# Altium footprint library Библиотека посадочных мест.PcbLib: 128 footprints (part 6 of 8)
Each footprint in its own frame and in the unit in brackets; x right, y up, seen from the top. Pads: shape width x height; smd on the part's side, far side on the other; paste and mask are expansions set on the pad; w line width, h text height; cw(c..) or ccw(c..) is an arc to the next point about the centre after c.
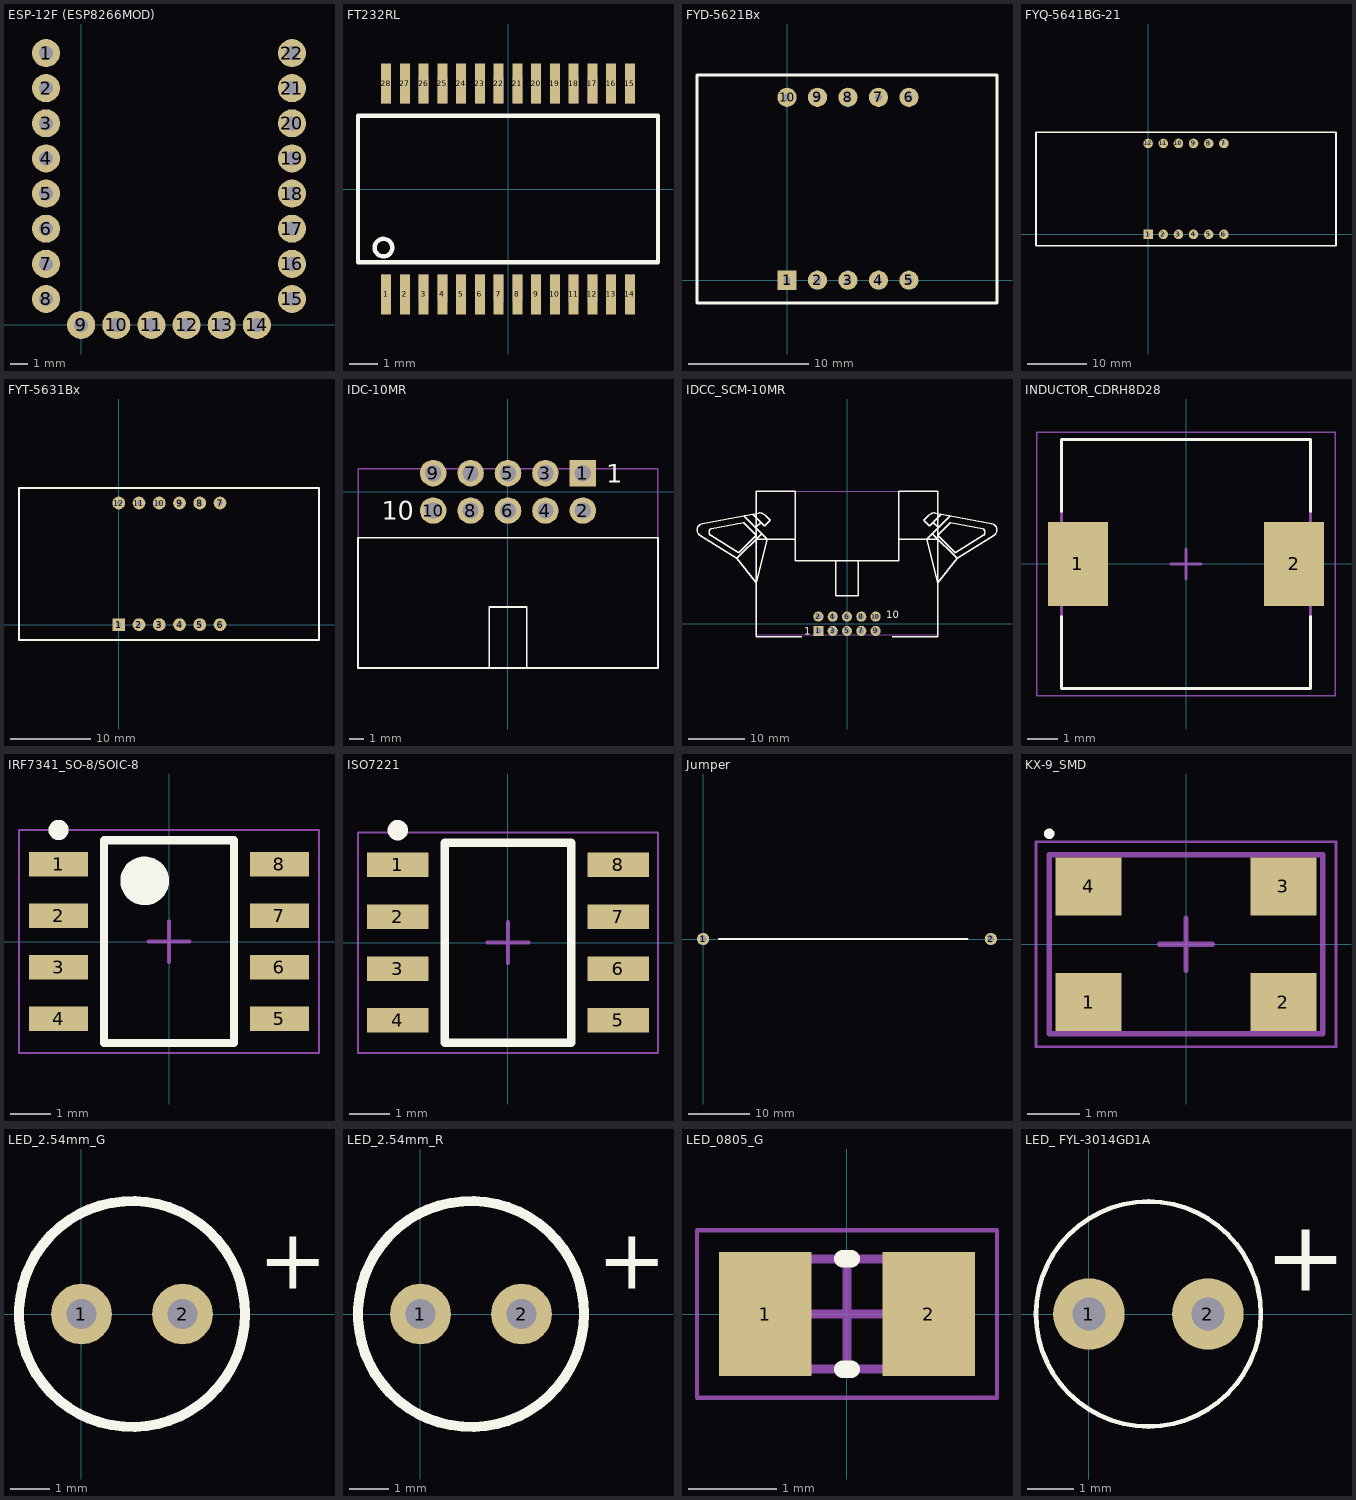
[diagram p5: the footprints below, top view; thin cyan lines are the x and y axes]

## ESP-12F (ESP8266MOD) [mm]
pads (22):
  round 1.6 hole 0.8: 1(-2,15.48) 2(-2,13.48) 3(-2,11.48) 4(-2,9.48) 5(-2,7.48) 6(-2,5.48) 7(-2,3.48) 8(-2,1.48) 9(0,0) 10(2,0) 11(4,0) 12(6,0) 13(8,0) 14(10,0) 15(12,1.48) 16(12,3.48) 17(12,5.48) 18(12,7.48) 19(12,9.48) 20(12,11.48) 21(12,13.48) 22(12,15.48)
3D body: height 0.25, standoff 0, extent -2,16 -2,16
3D body "PLS2-8(2mm).STEP": height 6, standoff -2.8, extent -3,0.48 -1,16.48
3D body "PLS2-8(2mm).STEP": height 6, standoff -2.8, extent 11,0.48 13,16.48
3D body "PLS2-6(2mm).STEP": height 2.8, standoff -6, extent -1,-1 11,1
3D body "ESP-12F.STEP": height 7.17, standoff 4, extent -3,0 13,24

## FT232RL [mm]
pads (28):
  rect 0.348x1.397 smd: 1(-4.225,-3.656) 2(-3.575,-3.656) 3(-2.925,-3.656) 4(-2.275,-3.656) 5(-1.625,-3.656) 6(-0.975,-3.656) 7(-0.325,-3.656) 8(0.325,-3.656) 9(0.975,-3.656) 10(1.625,-3.656) 11(2.275,-3.656) 12(2.925,-3.656) 13(3.575,-3.656) 14(4.225,-3.656) 15(4.225,3.656) 16(3.575,3.656) 17(2.925,3.656) 18(2.275,3.656) 19(1.625,3.656) 20(0.975,3.656) 21(0.325,3.656) 22(-0.325,3.656) 23(-0.975,3.656) 24(-1.625,3.656) 25(-2.275,3.656) 26(-2.925,3.656) 27(-3.575,3.656) 28(-4.225,3.656)
Top Overlay:
  circle w0.152: c-4.318,-2.032 r0.305
  lines w0.152: -5.2,-2.54 -5.2,2.54 5.2,2.54 5.2,-2.54 -5.2,-2.54
Mechanical 4:
  drawing of 56 lines, arcs and shapes, not listed
3D body "User Library-SSOP-28-FT232RL.STEP": height 2.16, standoff 0, extent -5.165,-3.878 5.165,3.878

## FYD-5621Bx [mm]
pads (10):
  rect 1.6x1.6 hole 0.6: 1(0,0)
  round 1.6 hole 0.6: 2(2.54,0) 3(5.08,0) 4(7.62,0) 5(10.16,0) 6(10.16,15.24) 7(7.62,15.24) 8(5.08,15.24) 9(2.54,15.24) 10(0,15.24)
Top Overlay:
  lines w0.254: -7.5,-1.9 17.5,-1.9 17.5,17.1 -7.5,17.1 -7.5,-1.9
3D body "Library-7SEG 2digit 1925.step": height 8, standoff -3, extent -7.5,-1.8 17.5,17.2

## FYQ-5641BG-21 [mm]
pads (12):
  rect 1.6x1.6 hole 0.6: 1(0,0)
  round 1.6 hole 0.6: 2(2.54,0) 3(5.08,0) 4(7.62,0) 5(10.16,0) 6(12.7,0) 7(12.7,15.24) 8(10.16,15.24) 9(7.62,15.24) 10(5.08,15.24) 11(2.54,15.24) 12(0,15.24)
Top Overlay:
  lines w0.254: -18.8,-1.9 31.5,-1.9 31.5,17.1 -18.8,17.1 -18.8,-1.9
3D body "7 segment 4 digit LED display.STEP": height 8, standoff -6.2, extent -18.85,-1.88 31.55,17.12

## FYT-5631Bx [mm]
pads (12):
  rect 1.6x1.6 hole 0.6: 1(0,0)
  round 1.6 hole 0.6: 2(2.54,0) 3(5.08,0) 4(7.62,0) 5(10.16,0) 6(12.7,0) 7(12.7,15.24) 8(10.16,15.24) 9(7.62,15.24) 10(5.08,15.24) 11(2.54,15.24) 12(0,15.24)
Top Overlay:
  lines w0.254: -12.5,-1.9 25.1,-1.9 25.1,17.1 -12.5,17.1 -12.5,-1.9
3D body "King Bright BX56-12A.STEP": height 8, standoff -4.1, extent -12.45,-1.905 25.15,17.095

## IDC-10MR [mm] "BH-10R (DS1013-10R) (IDC-10MR), Вилка на плату угловая 10 конт. 2.54мм"
height 9.1
pads (10):
  rect 1.8x1.8 hole 1.1: 1(5.08,1.27)
  round 1.8 hole 1.1: 2(5.08,-1.27) 3(2.54,1.27) 4(2.54,-1.27) 5(0,1.27) 6(0,-1.27) 7(-2.54,1.27) 8(-2.54,-1.27) 9(-5.08,1.27) 10(-5.08,-1.27)
Top Overlay:
  lines w0.127: -1.27,-11.96 -1.27,-7.825 1.27,-7.825 1.27,-11.96 ; -10.18,-11.96 -10.18,-3.11 10.18,-3.11 10.18,-11.96 ; -10.18,-11.96 10.18,-11.96 ; -10.18,-11.96 10.18,-11.96
  text "1" at 6.667,0.635 h1.27
  text "10" at -8.572,-1.905 h1.27
Mechanical 13:
  lines w0.1: -10.18,-11.96 -10.18,1.565 10.18,1.565 10.18,-11.96
3D body "61201021721.stp": height 9.13, standoff -2.7, extent -10.18,-11.96 10.18,1.59

## IDCC_SCM-10MR [mm] "SCM-10MR, Вилка угловая"
height 8.3
pads (10):
  rect 1.8x1.8 hole 1.02: 1(-5.08,-1.27)
  round 1.8 hole 1.02: 2(-5.08,1.27) 3(-2.54,-1.27) 4(-2.54,1.27) 5(0,-1.27) 6(0,1.27) 7(2.54,-1.27) 8(2.54,1.27) 9(5.08,-1.27) 10(5.08,1.27)
Top Overlay:
  lines w0.254: -26.138,15.759 cw(c-25.542,16.67) -25.625,17.756 ; -26.125,15.746 -19.535,11.594 ; -25.709,17.752 -15.776,19.647 ; -24.248,15.713 cw(c-23.778,16.248) -24.156,16.852 ; -24.203,15.677 -19.242,12.573 ; -24.113,16.869 -18.453,17.978 -18.369,17.978 -16.088,15.697 -19.175,12.61 ; -18.318,19.153 -14.171,15.005 -16.098,7.28 -19.535,11.594 ; -16.606,19.371 -14.676,17.44 -14.574,17.44 -13.713,18.302 -13.656,18.359 -14.524,19.228 ; -16.294,17.128 -16.162,17.128 -15.263,18.027 ; -16.1,15 -9.207,15 ; -15.775,19.644 cw(c-15.489,18.443) -14.525,19.215 ; -15.082,15.916 -15.212,15.916 -19.535,11.594 ; -8.05,-2.27 -16.1,-2.27 -16.1,23.5 -9.207,23.5 -9.207,11.2 9.208,11.2 ; -2,11.2 -2,5 2,5 2,11.2 ; 8.05,-2.27 16.1,-2.27 ; 14.524,19.228 13.656,18.359 13.713,18.302 14.574,17.44 14.675,17.44 16.606,19.371 ; 14.525,19.215 cw(c15.488,18.443) 15.775,19.644 ; 15.082,15.916 15.212,15.916 19.535,11.594 ; 15.263,18.027 16.162,17.128 16.294,17.128 ; 15.776,19.647 25.708,17.752 ; 18.318,19.153 14.171,15.005 16.098,7.28 19.535,11.594 ; 19.175,12.61 16.088,15.697 18.368,17.978 18.452,17.978 24.113,16.869 ; 19.242,12.573 24.203,15.677 ; 24.156,16.852 cw(c23.778,16.248) 24.248,15.713 ; 25.625,17.756 cw(c25.542,16.67) 26.138,15.759 ; 26.125,15.746 19.535,11.594 ; 9.208,11.2 9.208,23.5 16.1,23.5 16.1,-2.27 ; 9.208,11.2 9.208,15 16.1,15 16.1,-2.27
  text "10" at 6.985,0.953 h1.27
  text "1" at -7.62,-1.905 h1.27
Mechanical 13:
  lines w0.127: -16.1,-1.905 16.1,-1.905 16.1,23.495 -16.1,23.495 -16.1,-1.905
3D body "61201022121.stp": height 8.35, standoff -3.35, extent -16.1,-1.9 16.1,22.6

## INDUCTOR_CDRH8D28 [mm] "Precision Wire Wound Inductor, 2-Leads, Body 8,00x8,00mm, IPC Medium Density, INDP8080X30N"
height 3
pads (2):
  rect 2x2.8 smd: 1(-3.6,0) 2(3.6,0)
Top Overlay:
  lines w0.1: -4.15,-1.75 -4.15,-4.15 4.15,-4.15 4.15,-1.75 ; -4.15,1.75 -4.15,4.15 4.15,4.15 4.15,1.75
Mechanical 13:
  lines w0.1: -4.15,-4.15 -4.15,4.15 4.15,4.15 4.15,-4.15 -4.15,-4.15
Mechanical 15:
  lines w0.05: -4.975,-4.4 -4.975,4.4 4.975,4.4 4.975,-4.4 -4.975,-4.4
  lines w0.1: -0.5,0 0.5,0 ; 0,-0.5 0,0.5
3D body "User Library-CDRH8D28.step": height 2.8, standoff 0, extent -4.35,-4 4.35,4

## IRF7341_SO-8/SOIC-8 [mm]
height 1.75
pads (8):
  rect 1.45x0.6 smd: 1(-2.725,1.905) 2(-2.725,0.635) 3(-2.725,-0.635) 4(-2.725,-1.905) 5(2.725,-1.905) 6(2.725,-0.635) 7(2.725,0.635) 8(2.725,1.905)
Top Overlay:
  circle w0.6: c-0.6,1.5 r0.3
  circle w0.25: c-2.725,2.755 r0.125
  lines w0.2: -1.6,-2.5 1.6,-2.5 1.6,2.5 -1.6,2.5 -1.6,-2.5
Mechanical 15:
  lines w0.05: -3.7,-2.75 3.7,-2.75 3.7,2.75 -3.7,2.75 -3.7,-2.75
  lines w0.1: -0.5,0 0.5,0 ; 0,-0.5 0,0.5
3D body "User Library-so8-3.step": height 1.7, standoff 0, extent -3,-2.45 3,2.45

## ISO7221 [mm] "SOIC, 8-Leads, Body 4,90x3,90mm, Pitch 1,27mm, IPC Medium Density"
height 1.75
pads (8):
  rect 1.5x0.6 smd: 1(-2.7,1.905) 2(-2.7,0.635) 3(-2.7,-0.635) 4(-2.7,-1.905) 5(2.7,-1.905) 6(2.7,-0.635) 7(2.7,0.635) 8(2.7,1.905)
Top Overlay:
  circle w0.25: c-2.7,2.755 r0.125
  lines w0.2: -1.55,-2.45 -1.55,2.45 1.55,2.45 1.55,-2.45 -1.55,-2.45
Mechanical 15:
  lines w0.05: -3.675,-2.7 -3.675,2.7 3.675,2.7 3.675,-2.7 -3.675,-2.7
  lines w0.1: -0.5,0 0.5,0 ; 0,-0.5 0,0.5
3D body "R_8.step": height 1.76, standoff 0, extent -3.099,-2.502 3.099,2.502

## Jumper [mm]
pads (2):
  round 2 hole 1.1: 1(0,0) 2(46.95,0)
Top Overlay:
  lines w0.254: 2.54,0 43.18,0

## KX-9_SMD [mm]
height 1
pads (4):
  rect 1.25x1.1 smd: 1(-1.85,-1.1) 2(1.85,-1.1) 3(1.85,1.1) 4(-1.85,1.1)
Top Overlay:
  circle w0.1: c-2.6,2.1 r0.05
Mechanical 13:
  lines w0.1: -2.6,-1.7 -2.6,1.7 2.6,1.7 2.6,-1.7 -2.6,-1.7
Mechanical 15:
  lines w0.05: -2.85,-1.95 -2.85,1.95 2.85,1.95 2.85,-1.95 -2.85,-1.95
  lines w0.1: -0.5,0 0.5,0 ; 0,-0.5 0,0.5
3D body "KX-9_SMD.step": height 1, standoff 0, extent -2.6,-1.7 2.8,1.7

## LED_2.54mm_G [mil]
height 196.85
pads (2):
  round 60 hole 30: 1(0,0) 2(100,0)
Top Overlay:
  circle w10: c50,0 r111.8
  text "+" at 175,25 h60
3D body "LED_2.54.step": height 342.91, standoff -102.36, extent -45.08,-114.97 164.95,114.95

## LED_2.54mm_R [mil]
height 196.85
pads (2):
  round 60 hole 30: 1(0,0) 2(100,0)
Top Overlay:
  circle w10: c50,0 r111.8
  text "+" at 175,25 h60
3D body "521-9464.step": height 342.91, standoff -102.36, extent -45.08,-114.96 164.96,114.96

## LED_0805_G [mm]
height 1.3
pads (2):
  rect 1.05x1.4 smd: 1(-0.925,0) 2(0.925,0)
Top Overlay:
  lines w0.2: -0.05,-0.625 0.05,-0.625 ; -0.05,0.625 0.05,0.625
Mechanical 13:
  lines w0.1: -1,-0.625 -1,0.625 1,0.625 1,-0.625 -1,-0.625
Mechanical 15:
  lines w0.05: -1.7,-0.95 -1.7,0.95 1.7,0.95 1.7,-0.95 -1.7,-0.95
  lines w0.1: -0.5,0 0.5,0 ; 0,-0.5 0,0.5
3D body "User Library-KP-2012.STEP": height 1.1, standoff 0, extent -1.001,-0.625 1.001,0.625

## LED_ FYL-3014GD1A [mil]
height 196.85
pads (2):
  round 60 hole 27.56: 1(0,0) 2(100,0)
Top Overlay:
  circle w3.94: c50,0 r94.49
  text "+" at 147.64,19.68 h60
3D body "everlight-3MM-LED-GREEN.STEP": height 300.65, standoff -194.14, extent -10.07,-74.8 124.81,74.81